# Altium footprint library 我的器件.PCBLIB: 450 footprints (part 12 of 29)
Each footprint in its own frame and in the unit in brackets; x right, y up, seen from the top. Pads: shape width x height; smd on the part's side, far side on the other; paste and mask are expansions set on the pad; w line width, h text height; cw(c..) or ccw(c..) is an arc to the next point about the centre after c.
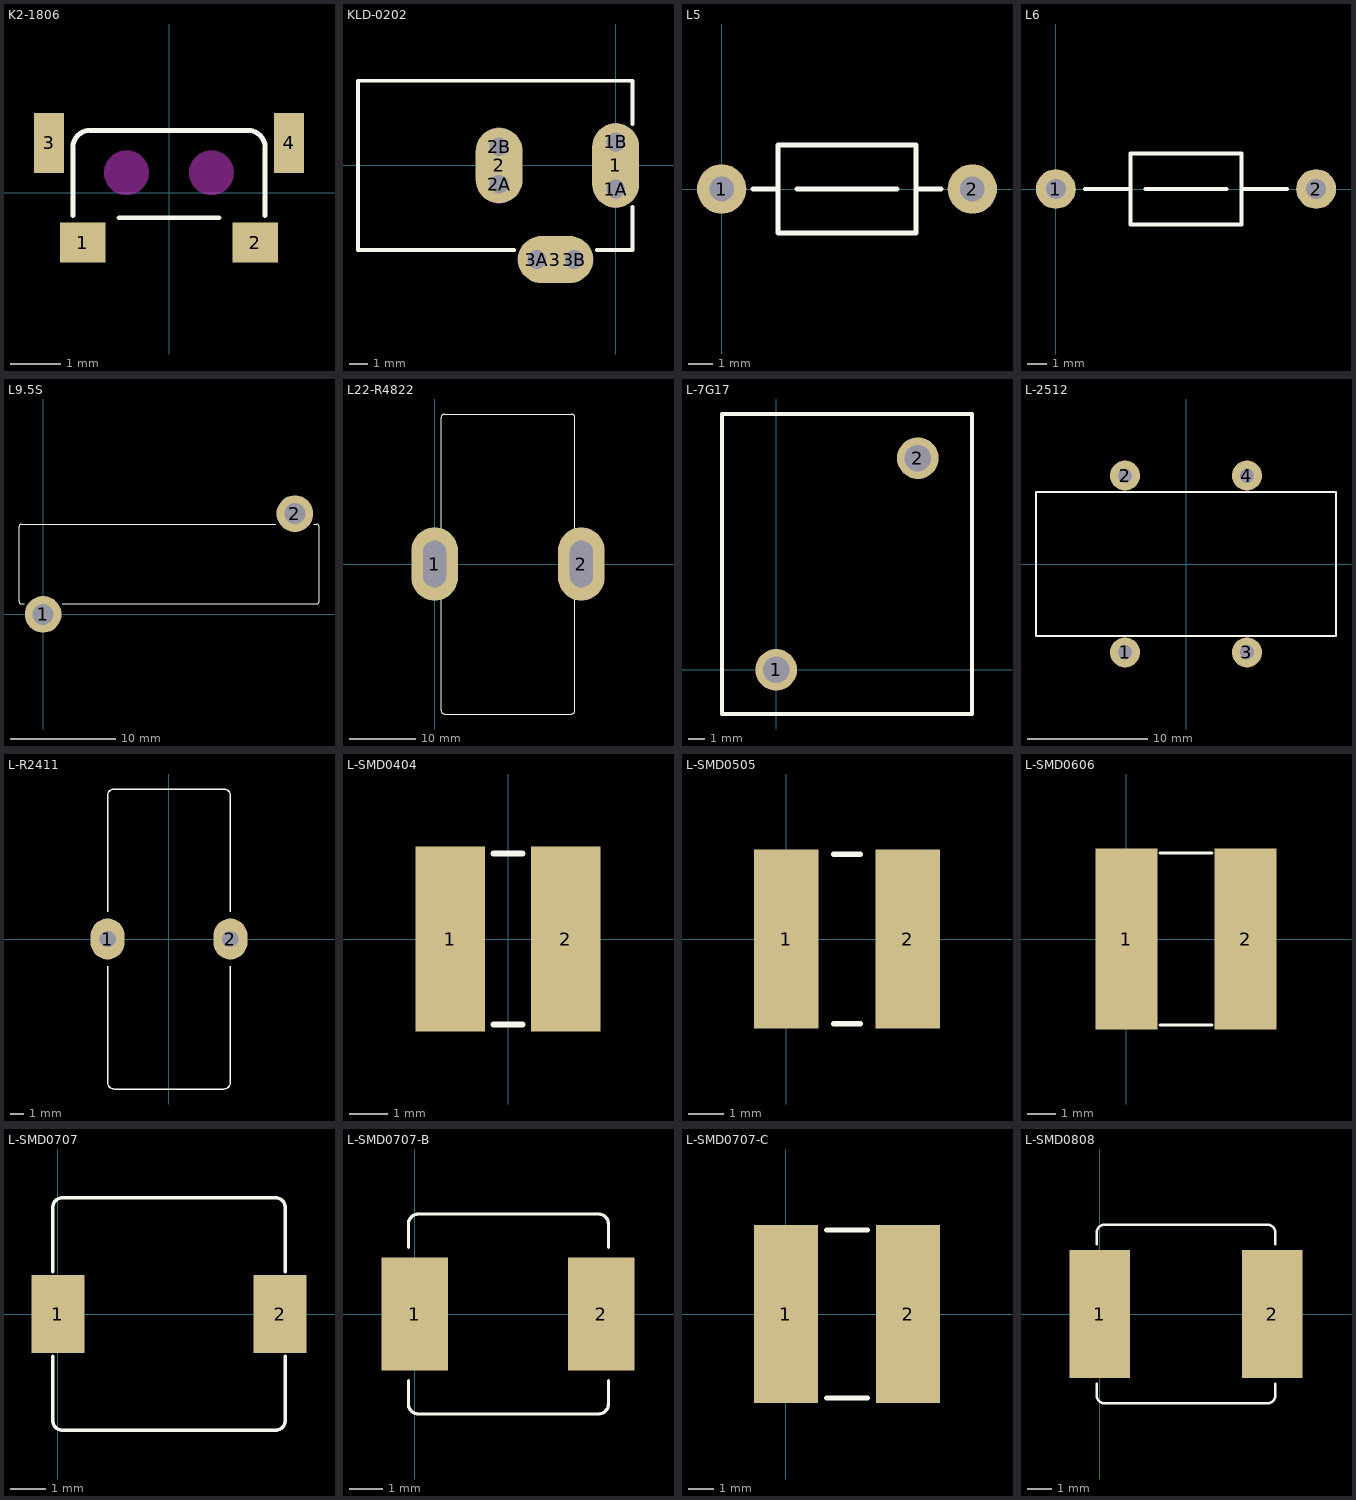
[diagram p11: the footprints below, top view; thin cyan lines are the x and y axes]

## K2-1806 [mm]
pads (4):
  rect 0.9x0.8 smd: 1(-1.725,-1) 2(1.725,-1)
  rect 0.6x1.2 smd: 3(-2.4,1) 4(2.4,1)
Top Overlay:
  lines w0.1: -1.925,-0.45 -1.925,0.9 cw(c-1.575,0.9) -1.575,1.25 1.575,1.25 cw(c1.575,0.9) 1.925,0.9 1.925,-0.45 ; -1,-0.5 1,-0.5
Keep-Out Layer:
  circle w0.1: c-0.85,0.4 r0.4
  circle w0.1: c0.85,0.4 r0.4
  board cut-out: -0.85,0.8 -0.77,0.8 -0.623,0.739 -0.511,0.627 -0.45,0.48 -0.45,0.4 -0.45,0.32 -0.511,0.173 -0.623,0.061 -0.77,0 -0.85,0 -0.93,0 -1.077,0.061 -1.189,0.173 -1.25,0.32 -1.25,0.4 -1.25,0.48 -1.189,0.627 -1.077,0.739 -0.93,0.8
  board cut-out: 0.85,0.8 0.77,0.8 0.623,0.739 0.511,0.627 0.45,0.48 0.45,0.4 0.45,0.32 0.511,0.173 0.623,0.061 0.77,0 0.85,0 0.93,0 1.077,0.061 1.189,0.173 1.25,0.32 1.25,0.4 1.25,0.48 1.189,0.627 1.077,0.739 0.93,0.8
3D body: height 0.2, standoff 0, extent 1.513,-1.1 1.937,-0.475
3D body: height 0.2, standoff 0, extent -1.937,-1.1 -1.513,-0.475
3D body: height 0.1, standoff -0.5, extent 0.55,0.1 1.149,0.7
3D body: height 1.88, standoff 0.88, extent -2.25,-0.95 2.25,1.25
3D body: height 1.88, standoff 0.08, extent -2.25,1.25 2.25,1.4
3D body: height 0.6, standoff 0, extent -2.4,0.6 2.4,1.4
3D body: height 1.3, standoff 0.5, extent -0.9,1.4 0.9,2.6
3D body: height 0.1, standoff -0.5, extent -1.15,0.1 -0.55,0.7
3D body: height 0.88, standoff 0.08, extent -2.25,-0.95 2.25,1.25
3D body: height 1.3, standoff 0.5, extent -2,1.4 -1.5,1.525
3D body: height 1.3, standoff 0.5, extent 1.5,1.4 2,1.525

## KLD-0202 [mm]
height 10.7
pads (9):
  oval 2.5x4.5 all layers, no hole: 1(0,0)
  round 1.5 hole 1: 1A(0,-1.25) 1B(0,1.25) 2A(-6.2,-1) 2B(-6.2,1) 3A(-4.2,-5) 3B(-2.2,-5)
  oval 2.5x4 all layers, no hole: 2(-6.2,0)
  oval 4x2.5 all layers, no hole: 3(-3.2,-5)
Top Overlay:
  lines w0.2: -5.4,-4.5 -13.7,-4.5 -13.7,4.5 0.9,4.5 0.9,2.2 ; -1,-4.5 0.9,-4.5 0.9,-2.2
Mechanical 1:
  lines w1: -6.2,-1 -6.2,1 ; -4.2,-5 -2.2,-5 ; 0,-1.25 0,1.25
Mechanical 2:
  lines w2.016: -6.2,-1 -6.2,1 ; -4.2,-5 -2.2,-5 ; 0,-1.25 0,1.25

## L5 [mm] "Body 3.6mmX6mm"
height 3.6
pads (2):
  round 2 hole 1: 1(0,0) 2(10.16,0)
Top Overlay:
  lines w0.2: 1.27,0 2.286,0 ; 3.048,0 7.112,0 ; 7.874,0 8.89,0 ; 2.286,-1.778 7.874,-1.778 7.874,1.778 2.286,1.778 2.286,-1.778

## L6 [mm]
pads (2):
  round 2 hole 1: 1(0,0) 2(13.081,0)
Top Overlay:
  lines w0.2: 1.46,0 3.746,0 ; 4.508,0 8.572,0 ; 9.335,0 11.62,0 ; 3.746,-1.778 3.746,1.778 9.335,1.778 9.335,-1.778 3.746,-1.778

## L9.5S [mm]
pads (2):
  round 3.5 hole 2: 1(0,0) 2(24,9.6)
Top Overlay:
  lines w0.1: -1.8,1 -2.1,1 cw(c-2.1,1.2) -2.3,1.2 -2.3,8.4 cw(c-2.1,8.4) -2.1,8.6 22.2,8.6 ; 1.8,1 26.1,1 ccw(c26.1,1.2) 26.3,1.2 26.3,8.4 ccw(c26.1,8.4) 26.1,8.6 25.8,8.6
3D body: height 5.5, standoff 1, extent 23.206,8.692 24.8,10.289
3D body: height 1, standoff -1.5, extent 23.206,8.692 24.8,10.289
3D body: height 1, standoff -1.5, extent -0.8,-0.689 0.794,0.908
3D body: height 5.5, standoff 1, extent -0.8,-0.689 0.794,0.908
3D body: height 9.47, standoff 1.5, extent -2.5,0.808 26.5,8.792
3D body: height 10.96, standoff 0, extent -0.8,-0.689 24.8,10.289

## L22-R4822 [mm]
pads (2):
  oval 7x11 hole 3.5 slot 7 at 90 deg: 1(0,0) 2(22,0)
Top Overlay:
  lines w0.1: 1,-4 1,-22 ccw(c1.5,-22) 1.5,-22.5 20.5,-22.5 ccw(c20.5,-22) 21,-22 21,-4 ; 1,4 1,22 cw(c1.5,22) 1.5,22.5 20.5,22.5 cw(c20.5,22) 21,22 21,4
3D body: height 47.81, standoff 0, extent 0,-23.953 22,23.953

## L-7G17 [mm]
pads (2):
  round 2.5 hole 1.6: 1(0,0) 2(8.5,12.7)
Top Overlay:
  lines w0.254: -3.25,-2.65 11.75,-2.65 11.75,15.35 -3.25,15.35 -3.25,-2.65
3D body: height 19, standoff 0, extent -3.25,-2.65 4.25,15.35
3D body: height 19, standoff 0, extent 5.25,-2.65 11.75,15.35
3D body: height 19, standoff 0, extent 4.25,11.875 5.275,15.35
3D body: height 19, standoff 0, extent 4.25,-2.65 5.275,0.825
3D body: height 17, standoff 0, extent 4.25,0.825 5.275,11.875

## L-2512 [mm]
height 25
pads (4):
  round 2.5 hole 1.2: 1(-5.08,-7.366) 2(-5.08,7.366) 3(5.08,-7.366) 4(5.08,7.366)
Top Overlay:
  lines w0.2: -12.5,-6 -12.5,6 12.5,6 12.5,-6 -12.5,-6

## L-R2411 [mm]
pads (2):
  oval 2.5x3 hole 1.2: 1(-4.5,0) 2(4.5,0)
Top Overlay:
  lines w0.1: -4.5,-2 -4.5,-10.5 ccw(c-4,-10.5) -4,-11 4,-11 ccw(c4,-10.5) 4.5,-10.5 4.5,-2 ; -4.5,2 -4.5,10.5 cw(c-4,10.5) -4,11 4,11 cw(c4,10.5) 4.5,10.5 4.5,2
3D body: height 0, standoff -2, extent 4.103,-0.399 4.9,0.399
3D body: height 0, standoff -2, extent -4.897,-0.399 -4.1,0.399
3D body: height 23.91, standoff 0, extent -5.5,-11.976 5.5,11.976

## L-SMD0404 [mm]
pads (2):
  rect 1.8x4.8 smd: 1(-1.5,0) 2(1.5,0)
Top Overlay:
  lines w0.15: -0.375,-2.225 0.375,-2.225 ; -0.375,2.225 0.375,2.225
3D body: height 1.5, standoff 0.1, extent -2.4,-2.4 2.4,2.4
3D body: height 2.2, standoff 0, extent -1.637,-1.647 1.65,1.647
3D body: height 2, standoff 0.09, extent -1.786,-1.796 1.8,1.797
3D body: height 1.99, standoff 1.5, extent -1.4,-1.4 2.4,2.4
3D body: height 1.99, standoff 1.5, extent -2.4,-2.4 1.4,1.4
3D body: height 1.8, standoff 1.5, extent 0.9,-2.4 2.4,-0.9
3D body: height 1.8, standoff 0, extent 1.225,-2.425 2.425,-1.225
3D body: height 1, standoff 0, extent 0.925,-2.425 2.425,-0.925
3D body: height 1, standoff 0, extent -2.425,0.925 -0.925,2.425
3D body: height 1.8, standoff 0, extent -2.425,1.225 -1.225,2.425
3D body: height 1.8, standoff 1.5, extent -2.4,0.9 -0.9,2.4

## L-SMD0505 [mm]
pads (2):
  rect 1.8x5 smd: 1(0,0) 2(3.4,0)
Top Overlay:
  lines w0.15: 1.325,-2.375 2.075,-2.375 ; 1.325,2.375 2.075,2.375
3D body: height 1.8, standoff 1.5, extent -0.7,0.9 0.8,2.4
3D body: height 1.8, standoff 0, extent -0.725,1.225 0.475,2.425
3D body: height 1, standoff 0, extent -0.725,0.925 0.775,2.425
3D body: height 1, standoff 0, extent 2.625,-2.425 4.125,-0.925
3D body: height 1.8, standoff 0, extent 2.925,-2.425 4.125,-1.225
3D body: height 1.8, standoff 1.5, extent 2.6,-2.4 4.1,-0.9
3D body: height 1.99, standoff 1.5, extent -0.9,-2.6 3.1,1.4
3D body: height 1.99, standoff 1.5, extent 0.3,-1.4 4.3,2.6
3D body: height 2, standoff 0.09, extent -0.086,-1.796 3.5,1.797
3D body: height 2.2, standoff 0, extent 0.063,-1.647 3.35,1.647
3D body: height 1.5, standoff 0.1, extent -0.9,-2.6 4.3,2.6

## L-SMD0606 [mm]
pads (2):
  rect 2.15x6.3 smd: 1(0,0) 2(4.15,0)
Top Overlay:
  lines w0.1: 1.175,-3 2.975,-3 ; 1.175,3 2.975,3
3D body: height 2.51, standoff 0, extent 4.375,-0.8 5.375,0.8
3D body: height 2.48, standoff 0, extent -1.125,-3.2 5.275,3.2
3D body: height 2.49, standoff 0, extent -0.316,-2.4 4.466,2.391
3D body: height 2.5, standoff 0, extent 0.083,-2 4.067,1.992
3D body: height 2.51, standoff 0, extent -1.225,-0.8 -0.225,0.8
3D body: height 2, standoff 0.5, extent -0.925,1.8 0.275,3
3D body: height 2, standoff 0.5, extent 3.875,-3 5.075,-1.8

## L-SMD0707 [mm]
pads (2):
  rect 1.5x2.2 smd: 1(0,0) 2(6.3,0)
Top Overlay:
  lines w0.1: -0.15,-1.2 -0.15,-3 ccw(c0.15,-3) 0.15,-3.3 6.15,-3.3 ccw(c6.15,-3) 6.45,-3 6.45,-1.2 ; -0.15,1.2 -0.15,3 cw(c0.15,3) 0.15,3.3 6.15,3.3 cw(c6.15,3) 6.45,3 6.45,1.2
3D body: height 1.5, standoff 1, extent 5.136,2 6.486,3.35
3D body: height 1.5, standoff 1, extent -0.186,-3.364 1.164,-2.014
3D body: height 1.1, standoff 0, extent 6.25,-1 6.75,1
3D body: height 1.1, standoff 0, extent -0.45,-1 0.05,1
3D body: height 1, standoff 0, extent -0.35,-3.5 6.65,3.5
3D body: height 4.48, standoff 0, extent -0.336,-3.5 6.636,3.486
3D body: height 4.49, standoff 0, extent 0.361,-2.8 5.939,2.789
3D body: height 4.5, standoff 0, extent 0.66,-2.5 5.64,2.49

## L-SMD0707-B [mm]
pads (2):
  rect 2x3.4 smd: 1(0,0) 2(5.6,0)
Top Overlay:
  lines w0.1: -0.187,-2 -0.187,-2.7 ccw(c0.113,-2.7) 0.113,-3 2.813,-3 5.513,-3 ccw(c5.513,-2.7) 5.813,-2.7 5.813,-2 ; -0.187,2 -0.187,2.7 cw(c0.113,2.7) 0.113,3 2.813,3 5.513,3 cw(c5.513,2.7) 5.813,2.7 5.813,2
3D body: height 2.5, standoff 0, extent 6.111,-1.599 6.261,1.601
3D body: height 0.15, standoff 0, extent 5.011,-1.599 6.261,1.601
3D body: height 0.15, standoff 0, extent -0.637,-1.6 0.613,1.6
3D body: height 3, standoff 0.1, extent -0.487,-3.3 6.113,3.3
3D body: height 2.5, standoff 0, extent -0.637,-1.6 -0.487,1.6

## L-SMD0707-C [mm]
pads (2):
  rect 2.5x7 smd: 1(0,0) 2(4.8,0)
Top Overlay:
  lines w0.2: 1.6,-3.3 3.2,-3.3 ; 1.6,3.3 3.2,3.3
3D body: height 5.5, standoff 0, extent -1.1,-3.5 4.275,1.875
3D body: height 4.5, standoff 0, extent -1.1,1.2 1.2,3.5
3D body: height 4.7, standoff 0, extent -0.875,1.525 0.9,3.275
3D body: height 5.4, standoff 0, extent -0.462,-2.85 3.45,1.05
3D body: height 5.4, standoff 0, extent 1.35,-1.05 5.262,2.85
3D body: height 4.7, standoff 0, extent 3.9,-3.275 5.675,-1.525
3D body: height 4.5, standoff 0, extent 3.6,-3.5 5.9,-1.2
3D body: height 5.5, standoff 0, extent 0.525,-1.875 5.9,3.5
3D body: height 5.5, standoff 0, extent -0.297,-2.699 5.1,2.699

## L-SMD0808 [mm]
pads (2):
  rect 2.5x5.3 smd: 1(0,0) 2(7.15,0)
Top Overlay:
  lines w0.1: -0.125,-2.9 -0.125,-3.4 ccw(c0.175,-3.4) 0.175,-3.7 6.975,-3.7 ccw(c6.975,-3.4) 7.275,-3.4 7.275,-2.9 ; -0.125,2.9 -0.125,3.4 cw(c0.175,3.4) 0.175,3.7 6.975,3.7 cw(c6.975,3.4) 7.275,3.4 7.275,2.9
3D body: height 3, standoff 0, extent -0.75,-2.55 -0.525,2.55
3D body: height 3, standoff 0, extent 7.675,-2.55 7.9,2.55
3D body: height 4, standoff 0.1, extent -0.525,-4.1 7.675,4.1